# Altium footprint library DIOT_temperature_logger.PcbLib: 100 footprints (part 7 of 7)
Each footprint in its own frame and in the unit in brackets; x right, y up, seen from the top. Pads: shape width x height; smd on the part's side, far side on the other; paste and mask are expansions set on the pad; w line width, h text height; cw(c..) or ccw(c..) is an arc to the next point about the centre after c.
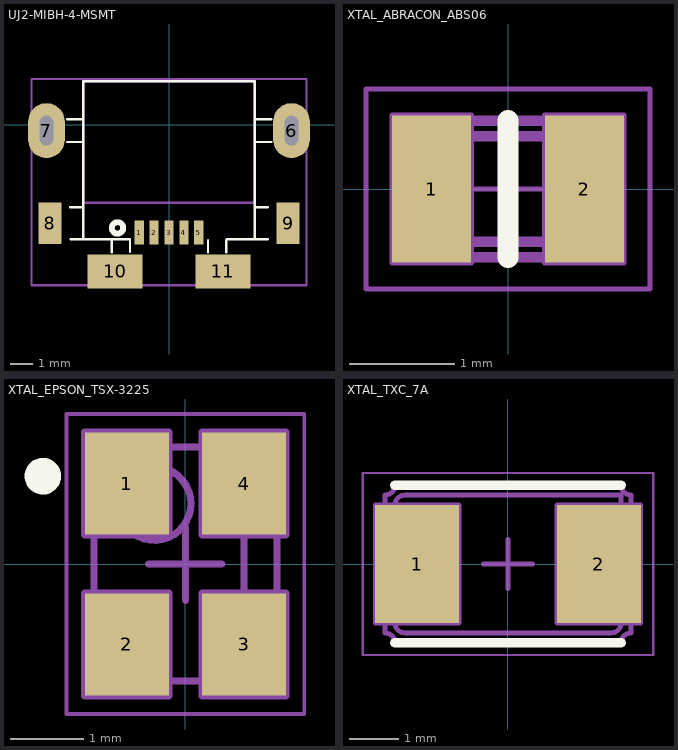
[diagram p6: the footprints below, top view; thin cyan lines are the x and y axes]

## UJ2-MIBH-4-MSMT [mm]
pads (11):
  rect 0.4x1.05 smd: 1(-1.3,-4.7) 2(-0.65,-4.7) 3(0,-4.7) 4(0.65,-4.7) 5(1.3,-4.7)
  oval 1.6x2.4 hole 0.6 slot 1.3 at 90 deg: 6(5.35,-0.25) 7(-5.35,-0.25)
  rect 1x1.8 smd: 8(-5.2,-4.3) 9(5.2,-4.3)
  rect 2.4x1.5 smd: 10(-2.35,-6.4) 11(2.35,-6.4)
Top Overlay:
  circle w0.254: c-2.25,-4.5 r0.25
  lines w0.1: -4.45,-0.75 -3.75,-0.75 ; -4.45,0.25 -3.75,0.25 ; -4.325,-3.6 -3.75,-3.6 ; -4.3,-5 -1.7,-5 -1.7,-5.55 ; -3.75,-5 -3.75,-4.8 -3.75,1.9 3.75,1.9 3.75,-4.8 ; -2.5,-5.575 -2.5,-5 ; 1.7,-5.575 1.7,-5.025 ; 2.5,-5.575 2.5,-5.025 2.525,-5 3.75,-5 ; 3.75,-3.6 4.325,-3.6 ; 3.75,-3.2 3.75,-5 ; 3.75,-0.75 4.475,-0.75 ; 3.75,0.25 4.475,0.25 ; 4.325,-5 4.325,-5 3.75,-5 ; 4.475,-0.75 4.475,-0.75
Mechanical 13:
  lines w0.1: -3.75,-3.4 -3.75,1.9 3.75,1.9 3.75,-3.4 -3.75,-3.4
Mechanical 15:
  lines w0.1: -6,-7 -6,2 6,2 6,-7 -6,-7
3D body "CUI_UJ2-MIBH-4-MSMT.step": height 0.9, standoff -1.81, extent -5.5,-6.8 5.5,1.9

## XTAL_ABRACON_ABS06 [mm]
pads (2):
  rect 0.75x1.4 smd: 1(-0.725,0) 2(0.725,0)
Top Overlay:
  lines w0.2: 0,-0.65 0,0.65
Mechanical 8:
  lines w0.05: -1.1,0 -0.725,0 ; -0.725,-0.7 -0.725,0 ; -0.725,0.7 -0.725,0 ; 0,-0.5 0,0 ; 0,0.5 0,0 ; 0.725,-0.7 0.725,0 ; 0.725,0.7 0.725,0 ; 1.1,0 0.725,0 ; -0.725,0 -0.35,0 0,0 ; 0,0 0.35,0 0.725,0 ; -1.1,-0.7 -0.35,-0.7 -0.35,0.7 -1.1,0.7 -1.1,-0.7 ; 0.35,-0.7 1.1,-0.7 1.1,0.7 0.35,0.7 0.35,-0.7
Mechanical 14:
  lines w0.1: -1.075,-0.55 cw(c-1.075,-0.65) -0.975,-0.65 0.975,-0.65 cw(c1.075,-0.65) 1.075,-0.55 1.075,0.55 cw(c1.075,0.65) 0.975,0.65 -0.975,0.65 cw(c-1.075,0.65) -1.075,0.55 -1.075,-0.55 ; -0.9,-0.4 ccw(c-0.8,-0.4) -0.8,-0.5 0.8,-0.5 ccw(c0.8,-0.4) 0.9,-0.4 0.9,0.4 ccw(c0.8,0.4) 0.8,0.5 -0.8,0.5 ccw(c-0.8,0.4) -0.9,0.4 -0.9,-0.4
Mechanical 15:
  lines w0.05: -1.35,-0.95 1.35,-0.95 1.35,0.95 -1.35,0.95 -1.35,-0.95
3D body "XTAL_ABRACON_ABS06.stp": height 0.6, standoff 0, extent -1.075,-0.65 1.075,0.65

## XTAL_EPSON_TSX-3225 [mm]
pads (4):
  rect 1.15x1.4 smd: 1(-0.8,1.1) 2(-0.8,-1.1) 3(0.8,-1.1) 4(0.8,1.1)
Top Overlay:
  circle w0.25: c-1.95,1.2 r0.125
Mechanical 8:
  lines w0.1: -1.3,-1.1 -0.8,-1.1 ; -1.3,1.1 -0.8,1.1 ; -0.8,-1.6 -0.8,-1.1 ; -0.8,-0.6 -0.8,-1.1 ; -0.8,0.6 -0.8,1.1 ; -0.8,1.6 -0.8,1.1 ; -0.75,0.93 -0.75,1.43 ; -0.5,0 0,0 ; -0.3,-1.1 -0.8,-1.1 ; -0.3,1.1 -0.8,1.1 ; 0,-0.5 0,0 ; 0,0.5 0,0 ; 0.3,-1.1 0.8,-1.1 ; 0.3,1.1 0.8,1.1 ; 0.5,0 0,0 ; 0.8,-1.6 0.8,-1.1 ; 0.8,-0.6 0.8,-1.1 ; 0.8,0.6 0.8,1.1 ; 0.8,1.6 0.8,1.1 ; 1.3,-1.1 0.8,-1.1 ; 1.3,1.1 0.8,1.1 ; 0.8,-1.1 0.8,1.1 ; -1.375,-1.8 -1.375,-0.4 -0.225,-0.4 -0.225,-1.8 -1.375,-1.8 ; -1.375,0.4 -1.375,1.8 -0.225,1.8 -0.225,0.4 -1.375,0.4 ; 0.225,-1.8 0.225,-0.4 1.375,-0.4 1.375,-1.8 0.225,-1.8 ; 0.225,0.4 0.225,1.8 1.375,1.8 1.375,0.4 0.225,0.4
Mechanical 14:
  circle w0.1: c-0.425,0.825 r0.5
  lines w0.1: -1.25,-1.5 cw(c-1.25,-1.6) -1.15,-1.6 1.15,-1.6 cw(c1.25,-1.6) 1.25,-1.5 1.25,1.5 cw(c1.25,1.6) 1.15,1.6 -1.15,1.6 cw(c-1.25,1.6) -1.25,1.5 -1.25,-1.5
Mechanical 15:
  lines w0.05: -1.625,-2.05 -1.625,2.05 1.625,2.05 1.625,-2.05 -1.625,-2.05
3D body "XTAL_EPSON_TSX-3225.stp": height 0.6, standoff 0, extent -1.25,-1.6 1.25,1.6

## XTAL_TXC_7A [mm]
pads (2):
  rect 1.7x2.4 smd: 1(-1.85,0) 2(1.85,0)
Top Overlay:
  lines w0.2: -2.3,-1.6 2.3,-1.6 ; -2.3,1.6 2.3,1.6
Mechanical 8:
  lines w0.1: -2.35,0 -1.85,0 ; -1.85,-0.5 -1.85,0 ; -1.85,0.5 -1.85,0 ; -1.35,0 -1.85,0 ; -0.5,0 0,0 ; 0,-0.5 0,0 ; 0,0.5 0,0 ; 0.5,0 0,0 ; 1.35,0 1.85,0 ; 1.85,-0.5 1.85,0 ; 1.85,0.5 1.85,0 ; 2.35,0 1.85,0 ; -2.7,-1.2 -1,-1.2 -1,1.2 -2.7,1.2 -2.7,-1.2 ; 1,-1.2 2.7,-1.2 2.7,1.2 1,1.2 1,-1.2
Mechanical 14:
  lines w0.1: -2.5,-1.4 cw(c-2.5,-1.6) -2.3,-1.6 2.3,-1.6 cw(c2.5,-1.6) 2.5,-1.4 2.5,-0.5 cw(c2.5,-0.4) 2.4,-0.4 2.4,0.4 cw(c2.5,0.4) 2.5,0.5 2.5,1.4 cw(c2.5,1.6) 2.3,1.6 -2.3,1.6 cw(c-2.5,1.6) -2.5,1.4 -2.5,0.5 cw(c-2.5,0.4) -2.4,0.4 -2.4,-0.4 cw(c-2.5,-0.4) -2.5,-0.5 -2.5,-1.4 ; -2.3,-1.2 ccw(c-2.1,-1.2) -2.1,-1.4 2.1,-1.4 ccw(c2.1,-1.2) 2.3,-1.2 2.3,1.4 -2.1,1.4 ccw(c-2.1,1.2) -2.3,1.2 -2.3,-1.2
Mechanical 15:
  lines w0.05: -2.95,-1.85 2.95,-1.85 2.95,1.85 -2.95,1.85 -2.95,-1.85
3D body "XTAL_TXC_7A.stp": height 1.2, standoff 0, extent -2.501,-1.6 2.5,1.6